# Altium footprint library ST封装.PcbLib: 1336 footprints (part 71 of 109)
Each footprint in its own frame and in the unit in brackets; x right, y up, seen from the top. Pads: shape width x height; smd on the part's side, far side on the other; paste and mask are expansions set on the pad; w line width, h text height; cw(c..) or ccw(c..) is an arc to the next point about the centre after c.
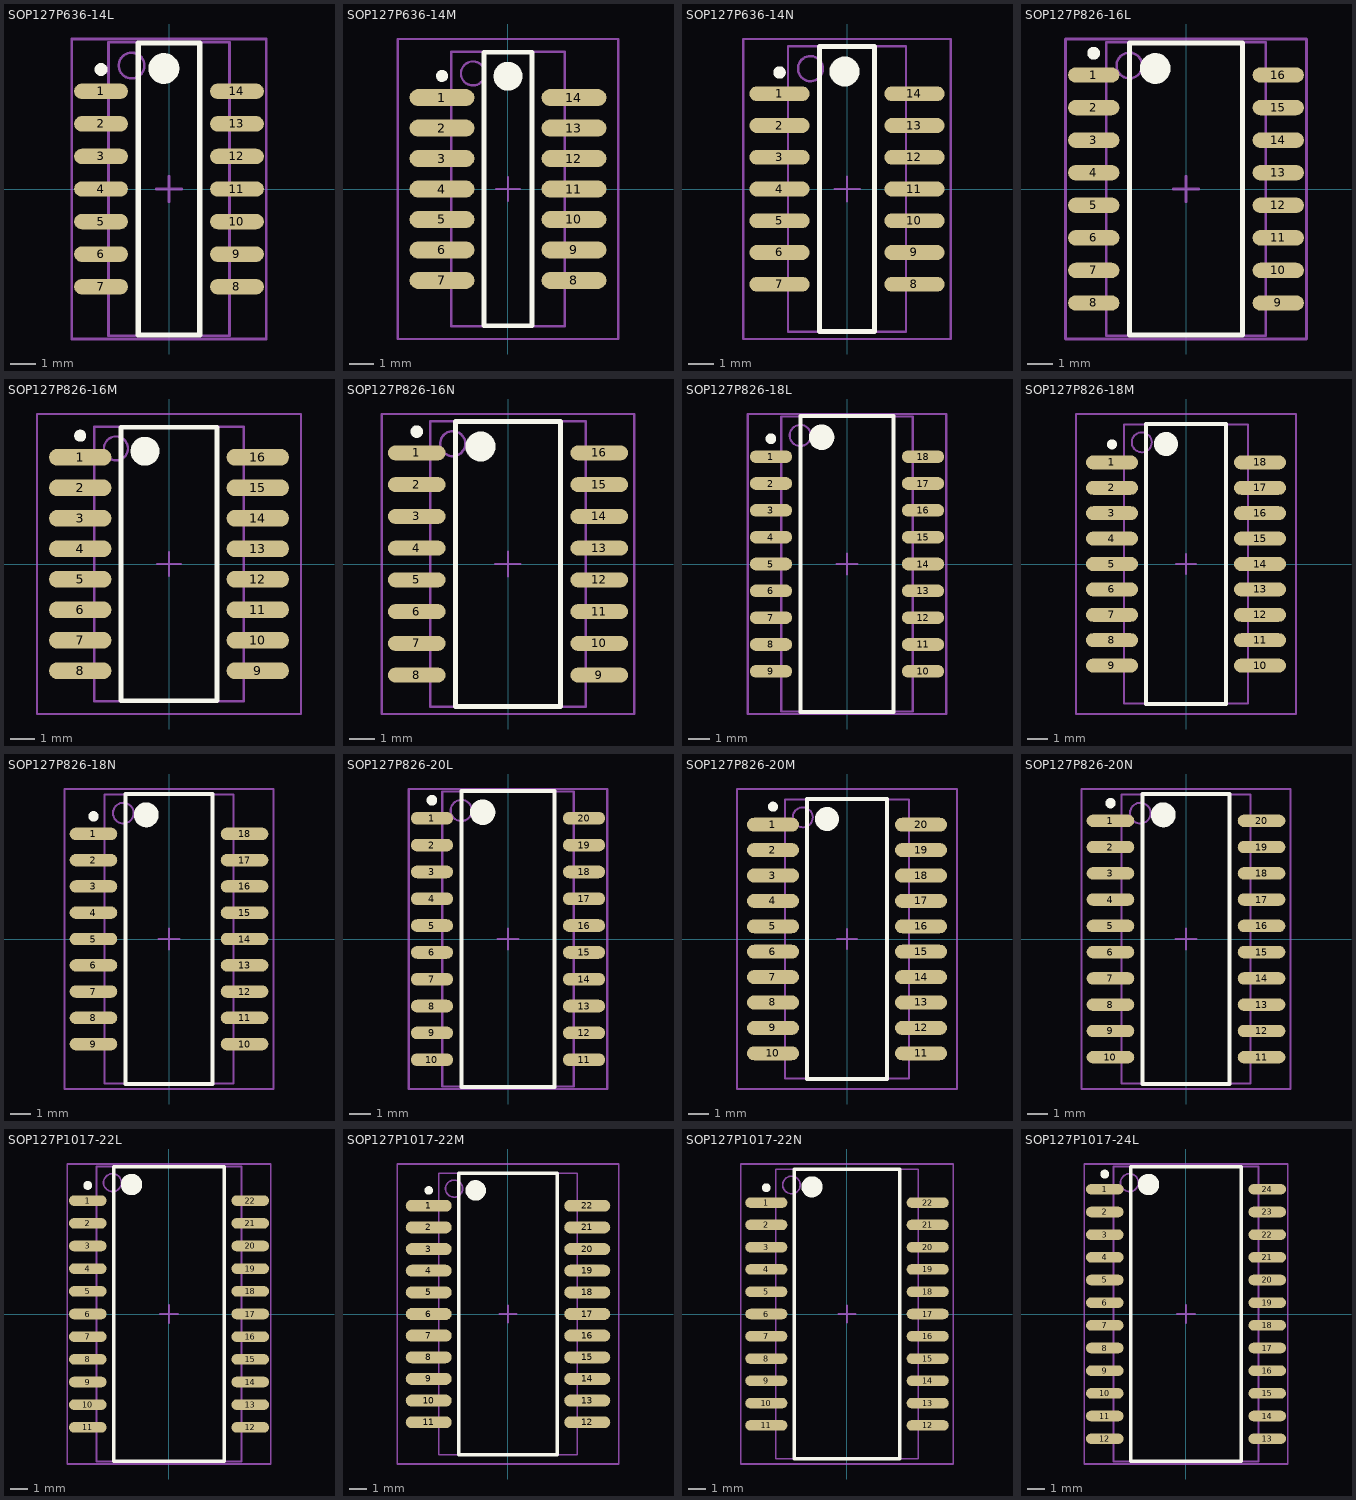
[diagram p70: the footprints below, top view; thin cyan lines are the x and y axes]

## SOP127P636-14L [mm] "SOP, 14-Leads, Body 11x4.7mm, Pitch 1.27mm, IPC High Density"
height 1.5
pads (14):
  oval 2.1x0.6 smd: 1(-2.65,3.81) 2(-2.65,2.54) 3(-2.65,1.27) 4(-2.65,0) 5(-2.65,-1.27) 6(-2.65,-2.54) 7(-2.65,-3.81) 8(2.65,-3.81) 9(2.65,-2.54) 10(2.65,-1.27) 11(2.65,0) 12(2.65,1.27) 13(2.65,2.54) 14(2.65,3.81)
Top Overlay:
  circle w0.6: c-0.2,4.7 r0.3
  circle w0.25: c-2.65,4.66 r0.125
  lines w0.2: -1.2,-5.7 1.2,-5.7 1.2,5.7 -1.2,5.7 -1.2,-5.7
Mechanical 13:
  circle w0.1: c-1.46,4.815 r0.5
  lines w0.1: -2.36,-5.715 2.36,-5.715 2.36,5.715 -2.36,5.715 -2.36,-5.715
Mechanical 15:
  lines w0.1: -0.5,0 0.5,0 ; 0,-0.5 0,0.5 ; -3.8,-5.85 3.8,-5.85 3.8,5.85 -3.8,5.85 -3.8,-5.85
3D body: height 1.5, standoff 0, extent -2.36,-5.715 2.36,5.715

## SOP127P636-14M [mm] "SOP, 14-Leads, Body 11x4.7mm, Pitch 1.27mm, IPC Low Density"
height 1.5
pads (14):
  oval 2.7x0.7 smd: 1(-2.75,3.81) 2(-2.75,2.54) 3(-2.75,1.27) 4(-2.75,0) 5(-2.75,-1.27) 6(-2.75,-2.54) 7(-2.75,-3.81) 8(2.75,-3.81) 9(2.75,-2.54) 10(2.75,-1.27) 11(2.75,0) 12(2.75,1.27) 13(2.75,2.54) 14(2.75,3.81)
Top Overlay:
  circle w0.6: c0,4.7 r0.3
  circle w0.25: c-2.75,4.71 r0.125
  lines w0.2: -1,-5.7 1,-5.7 1,5.7 -1,5.7 -1,-5.7
Mechanical 13:
  circle w0.1: c-1.46,4.815 r0.5
  lines w0.1: -2.36,-5.715 2.36,-5.715 2.36,5.715 -2.36,5.715 -2.36,-5.715
Mechanical 15:
  lines w0.1: -0.5,0 0.5,0 ; 0,-0.5 0,0.5 ; -4.6,-6.25 4.6,-6.25 4.6,6.25 -4.6,6.25 -4.6,-6.25
3D body: height 1.5, standoff 0, extent -2.36,-5.715 2.36,5.715

## SOP127P636-14N [mm] "SOP, 14-Leads, Body 11x4.7mm, Pitch 1.27mm, IPC Medium Density"
height 1.5
pads (14):
  oval 2.4x0.6 smd: 1(-2.7,3.81) 2(-2.7,2.54) 3(-2.7,1.27) 4(-2.7,0) 5(-2.7,-1.27) 6(-2.7,-2.54) 7(-2.7,-3.81) 8(2.7,-3.81) 9(2.7,-2.54) 10(2.7,-1.27) 11(2.7,0) 12(2.7,1.27) 13(2.7,2.54) 14(2.7,3.81)
Top Overlay:
  circle w0.6: c-0.1,4.7 r0.3
  circle w0.25: c-2.7,4.66 r0.125
  lines w0.2: -1.1,-5.7 1.1,-5.7 1.1,5.7 -1.1,5.7 -1.1,-5.7
Mechanical 13:
  circle w0.1: c-1.46,4.815 r0.5
  lines w0.1: -2.36,-5.715 2.36,-5.715 2.36,5.715 -2.36,5.715 -2.36,-5.715
Mechanical 15:
  lines w0.1: -0.5,0 0.5,0 ; 0,-0.5 0,0.5 ; -4.15,-6 4.15,-6 4.15,6 -4.15,6 -4.15,-6
3D body: height 1.5, standoff 0, extent -2.36,-5.715 2.36,5.715

## SOP127P826-16L [mm] "SOP, 16-Leads, Body 11x6.2mm, Pitch 1.27mm, IPC High Density"
height 2
pads (16):
  oval 2x0.6 smd: 1(-3.6,4.445) 2(-3.6,3.175) 3(-3.6,1.905) 4(-3.6,0.635) 5(-3.6,-0.635) 6(-3.6,-1.905) 7(-3.6,-3.175) 8(-3.6,-4.445) 9(3.6,-4.445) 10(3.6,-3.175) 11(3.6,-1.905) 12(3.6,-0.635) 13(3.6,0.635) 14(3.6,1.905) 15(3.6,3.175) 16(3.6,4.445)
Top Overlay:
  circle w0.25: c-3.6,5.295 r0.125
  circle w0.6: c-1.2,4.7 r0.3
  lines w0.2: -2.2,-5.7 -2.2,5.7 2.2,5.7 2.2,-5.7 -2.2,-5.7
Mechanical 13:
  circle w0.1: c-2.21,4.815 r0.5
  lines w0.1: -3.11,-5.715 -3.11,5.715 3.11,5.715 3.11,-5.715 -3.11,-5.715
Mechanical 15:
  lines w0.1: -0.5,0 0.5,0 ; 0,-0.5 0,0.5 ; -4.7,-5.85 -4.7,5.85 4.7,5.85 4.7,-5.85 -4.7,-5.85
3D body: height 2, standoff 0, extent -3.11,-5.715 3.11,5.715

## SOP127P826-16M [mm] "SOP, 16-Leads, Body 11x6.2mm, Pitch 1.27mm, IPC Low Density"
height 2
pads (16):
  oval 2.6x0.7 smd: 1(-3.7,4.445) 2(-3.7,3.175) 3(-3.7,1.905) 4(-3.7,0.635) 5(-3.7,-0.635) 6(-3.7,-1.905) 7(-3.7,-3.175) 8(-3.7,-4.445) 9(3.7,-4.445) 10(3.7,-3.175) 11(3.7,-1.905) 12(3.7,-0.635) 13(3.7,0.635) 14(3.7,1.905) 15(3.7,3.175) 16(3.7,4.445)
Top Overlay:
  circle w0.25: c-3.7,5.345 r0.125
  circle w0.6: c-1,4.7 r0.3
  lines w0.2: -2,-5.7 -2,5.7 2,5.7 2,-5.7 -2,-5.7
Mechanical 13:
  circle w0.1: c-2.21,4.815 r0.5
  lines w0.1: -3.11,-5.715 -3.11,5.715 3.11,5.715 3.11,-5.715 -3.11,-5.715
Mechanical 15:
  lines w0.1: -0.5,0 0.5,0 ; 0,-0.5 0,0.5 ; -5.5,-6.25 -5.5,6.25 5.5,6.25 5.5,-6.25 -5.5,-6.25
3D body: height 2, standoff 0, extent -3.11,-5.715 3.11,5.715

## SOP127P826-16N [mm] "SOP, 16-Leads, Body 11x6.2mm, Pitch 1.27mm, IPC Medium Density"
height 2
pads (16):
  oval 2.3x0.6 smd: 1(-3.65,4.445) 2(-3.65,3.175) 3(-3.65,1.905) 4(-3.65,0.635) 5(-3.65,-0.635) 6(-3.65,-1.905) 7(-3.65,-3.175) 8(-3.65,-4.445) 9(3.65,-4.445) 10(3.65,-3.175) 11(3.65,-1.905) 12(3.65,-0.635) 13(3.65,0.635) 14(3.65,1.905) 15(3.65,3.175) 16(3.65,4.445)
Top Overlay:
  circle w0.25: c-3.65,5.295 r0.125
  circle w0.6: c-1.1,4.7 r0.3
  lines w0.2: -2.1,-5.7 -2.1,5.7 2.1,5.7 2.1,-5.7 -2.1,-5.7
Mechanical 13:
  circle w0.1: c-2.21,4.815 r0.5
  lines w0.1: -3.11,-5.715 -3.11,5.715 3.11,5.715 3.11,-5.715 -3.11,-5.715
Mechanical 15:
  lines w0.1: -0.5,0 0.5,0 ; 0,-0.5 0,0.5 ; -5.05,-6 -5.05,6 5.05,6 5.05,-6 -5.05,-6
3D body: height 2, standoff 0, extent -3.11,-5.715 3.11,5.715

## SOP127P826-18L [mm] "SOP, 18-Leads, Body 13.4x6.2mm, Pitch 1.27mm, IPC High Density"
height 2
pads (18):
  oval 2x0.6 smd: 1(-3.6,5.08) 2(-3.6,3.81) 3(-3.6,2.54) 4(-3.6,1.27) 5(-3.6,0) 6(-3.6,-1.27) 7(-3.6,-2.54) 8(-3.6,-3.81) 9(-3.6,-5.08) 10(3.6,-5.08) 11(3.6,-3.81) 12(3.6,-2.54) 13(3.6,-1.27) 14(3.6,0) 15(3.6,1.27) 16(3.6,2.54) 17(3.6,3.81) 18(3.6,5.08)
Top Overlay:
  circle w0.25: c-3.6,5.93 r0.125
  circle w0.6: c-1.2,6 r0.3
  lines w0.2: -2.2,-7 -2.2,7 2.2,7 2.2,-7 -2.2,-7
Mechanical 13:
  circle w0.1: c-2.21,6.085 r0.5
  lines w0.1: -3.11,-6.985 -3.11,6.985 3.11,6.985 3.11,-6.985 -3.11,-6.985
Mechanical 15:
  lines w0.1: -0.5,0 0.5,0 ; 0,-0.5 0,0.5 ; -4.7,-7.1 -4.7,7.1 4.7,7.1 4.7,-7.1 -4.7,-7.1
3D body: height 2, standoff 0, extent -3.11,-6.985 3.11,6.985

## SOP127P826-18M [mm] "SOP, 18-Leads, Body 13.4x6.2mm, Pitch 1.27mm, IPC Low Density"
height 2
pads (18):
  oval 2.6x0.7 smd: 1(-3.7,5.08) 2(-3.7,3.81) 3(-3.7,2.54) 4(-3.7,1.27) 5(-3.7,0) 6(-3.7,-1.27) 7(-3.7,-2.54) 8(-3.7,-3.81) 9(-3.7,-5.08) 10(3.7,-5.08) 11(3.7,-3.81) 12(3.7,-2.54) 13(3.7,-1.27) 14(3.7,0) 15(3.7,1.27) 16(3.7,2.54) 17(3.7,3.81) 18(3.7,5.08)
Top Overlay:
  circle w0.25: c-3.7,5.98 r0.125
  circle w0.6: c-1,6 r0.3
  lines w0.2: -2,-7 -2,7 2,7 2,-7 -2,-7
Mechanical 13:
  circle w0.1: c-2.21,6.085 r0.5
  lines w0.1: -3.11,-6.985 -3.11,6.985 3.11,6.985 3.11,-6.985 -3.11,-6.985
Mechanical 15:
  lines w0.1: -0.5,0 0.5,0 ; 0,-0.5 0,0.5 ; -5.5,-7.5 -5.5,7.5 5.5,7.5 5.5,-7.5 -5.5,-7.5
3D body: height 2, standoff 0, extent -3.11,-6.985 3.11,6.985

## SOP127P826-18N [mm] "SOP, 18-Leads, Body 13.4x6.2mm, Pitch 1.27mm, IPC Medium Density"
height 2
pads (18):
  oval 2.3x0.6 smd: 1(-3.65,5.08) 2(-3.65,3.81) 3(-3.65,2.54) 4(-3.65,1.27) 5(-3.65,0) 6(-3.65,-1.27) 7(-3.65,-2.54) 8(-3.65,-3.81) 9(-3.65,-5.08) 10(3.65,-5.08) 11(3.65,-3.81) 12(3.65,-2.54) 13(3.65,-1.27) 14(3.65,0) 15(3.65,1.27) 16(3.65,2.54) 17(3.65,3.81) 18(3.65,5.08)
Top Overlay:
  circle w0.6: c-1.1,6 r0.3
  circle w0.25: c-3.65,5.93 r0.125
  lines w0.2: -2.1,-7 2.1,-7 2.1,7 -2.1,7 -2.1,-7
Mechanical 13:
  circle w0.1: c-2.21,6.085 r0.5
  lines w0.1: -3.11,-6.985 3.11,-6.985 3.11,6.985 -3.11,6.985 -3.11,-6.985
Mechanical 15:
  lines w0.1: -0.5,0 0.5,0 ; 0,-0.5 0,0.5 ; -5.05,-7.25 5.05,-7.25 5.05,7.25 -5.05,7.25 -5.05,-7.25
3D body: height 2, standoff 0, extent -3.11,-6.985 3.11,6.985

## SOP127P826-20L [mm] "SOP, 20-Leads, Body 13.4x6.2mm, Pitch 1.27mm, IPC High Density"
height 2
pads (20):
  oval 2x0.6 smd: 1(-3.6,5.715) 2(-3.6,4.445) 3(-3.6,3.175) 4(-3.6,1.905) 5(-3.6,0.635) 6(-3.6,-0.635) 7(-3.6,-1.905) 8(-3.6,-3.175) 9(-3.6,-4.445) 10(-3.6,-5.715) 11(3.6,-5.715) 12(3.6,-4.445) 13(3.6,-3.175) 14(3.6,-1.905) 15(3.6,-0.635) 16(3.6,0.635) 17(3.6,1.905) 18(3.6,3.175) 19(3.6,4.445) 20(3.6,5.715)
Top Overlay:
  circle w0.6: c-1.2,6 r0.3
  circle w0.25: c-3.6,6.565 r0.125
  lines w0.2: -2.2,-7 2.2,-7 2.2,7 -2.2,7 -2.2,-7
Mechanical 13:
  circle w0.1: c-2.21,6.085 r0.5
  lines w0.1: -3.11,-6.985 3.11,-6.985 3.11,6.985 -3.11,6.985 -3.11,-6.985
Mechanical 15:
  lines w0.1: -0.5,0 0.5,0 ; 0,-0.5 0,0.5 ; -4.7,-7.1 4.7,-7.1 4.7,7.1 -4.7,7.1 -4.7,-7.1
3D body: height 2, standoff 0, extent -3.11,-6.985 3.11,6.985

## SOP127P826-20M [mm] "SOP, 20-Leads, Body 13.4x6.2mm, Pitch 1.27mm, IPC Low Density"
height 2
pads (20):
  oval 2.6x0.7 smd: 1(-3.7,5.715) 2(-3.7,4.445) 3(-3.7,3.175) 4(-3.7,1.905) 5(-3.7,0.635) 6(-3.7,-0.635) 7(-3.7,-1.905) 8(-3.7,-3.175) 9(-3.7,-4.445) 10(-3.7,-5.715) 11(3.7,-5.715) 12(3.7,-4.445) 13(3.7,-3.175) 14(3.7,-1.905) 15(3.7,-0.635) 16(3.7,0.635) 17(3.7,1.905) 18(3.7,3.175) 19(3.7,4.445) 20(3.7,5.715)
Top Overlay:
  circle w0.6: c-1,6 r0.3
  circle w0.25: c-3.7,6.615 r0.125
  lines w0.2: -2,-7 2,-7 2,7 -2,7 -2,-7
Mechanical 13:
  circle w0.1: c-2.21,6.085 r0.5
  lines w0.1: -3.11,-6.985 3.11,-6.985 3.11,6.985 -3.11,6.985 -3.11,-6.985
Mechanical 15:
  lines w0.1: -0.5,0 0.5,0 ; 0,-0.5 0,0.5 ; -5.5,-7.5 5.5,-7.5 5.5,7.5 -5.5,7.5 -5.5,-7.5
3D body: height 2, standoff 0, extent -3.11,-6.985 3.11,6.985

## SOP127P826-20N [mm] "SOP, 20-Leads, Body 13.4x6.2mm, Pitch 1.27mm, IPC Medium Density"
height 2
pads (20):
  oval 2.3x0.6 smd: 1(-3.65,5.715) 2(-3.65,4.445) 3(-3.65,3.175) 4(-3.65,1.905) 5(-3.65,0.635) 6(-3.65,-0.635) 7(-3.65,-1.905) 8(-3.65,-3.175) 9(-3.65,-4.445) 10(-3.65,-5.715) 11(3.65,-5.715) 12(3.65,-4.445) 13(3.65,-3.175) 14(3.65,-1.905) 15(3.65,-0.635) 16(3.65,0.635) 17(3.65,1.905) 18(3.65,3.175) 19(3.65,4.445) 20(3.65,5.715)
Top Overlay:
  circle w0.25: c-3.65,6.565 r0.125
  circle w0.6: c-1.1,6 r0.3
  lines w0.2: -2.1,-7 -2.1,7 2.1,7 2.1,-7 -2.1,-7
Mechanical 13:
  circle w0.1: c-2.21,6.085 r0.5
  lines w0.1: -3.11,-6.985 -3.11,6.985 3.11,6.985 3.11,-6.985 -3.11,-6.985
Mechanical 15:
  lines w0.1: -0.5,0 0.5,0 ; 0,-0.5 0,0.5 ; -5.05,-7.25 -5.05,7.25 5.05,7.25 5.05,-7.25 -5.05,-7.25
3D body: height 2, standoff 0, extent -3.11,-6.985 3.11,6.985

## SOP127P1017-22L [mm] "SOP, 22-Leads, Body 15.6x8.1mm, Pitch 1.27mm, IPC High Density"
height 2.5
pads (22):
  oval 2.1x0.6 smd: 1(-4.55,6.35) 2(-4.55,5.08) 3(-4.55,3.81) 4(-4.55,2.54) 5(-4.55,1.27) 6(-4.55,0) 7(-4.55,-1.27) 8(-4.55,-2.54) 9(-4.55,-3.81) 10(-4.55,-5.08) 11(-4.55,-6.35) 12(4.55,-6.35) 13(4.55,-5.08) 14(4.55,-3.81) 15(4.55,-2.54) 16(4.55,-1.27) 17(4.55,0) 18(4.55,1.27) 19(4.55,2.54) 20(4.55,3.81) 21(4.55,5.08) 22(4.55,6.35)
Top Overlay:
  circle w0.6: c-2.1,7.25 r0.3
  circle w0.25: c-4.55,7.2 r0.125
  lines w0.2: -3.1,-8.25 3.1,-8.25 3.1,8.25 -3.1,8.25 -3.1,-8.25
Mechanical 13:
  circle w0.1: c-3.165,7.355 r0.5
  lines w0.1: -4.065,-8.255 4.065,-8.255 4.065,8.255 -4.065,8.255 -4.065,-8.255
Mechanical 15:
  lines w0.1: -0.5,0 0.5,0 ; 0,-0.5 0,0.5 ; -5.7,-8.4 5.7,-8.4 5.7,8.4 -5.7,8.4 -5.7,-8.4
3D body: height 2.5, standoff 0, extent -4.065,-8.255 4.065,8.255

## SOP127P1017-22M [mm] "SOP, 22-Leads, Body 15.6x8.1mm, Pitch 1.27mm, IPC Low Density"
height 2.5
pads (22):
  oval 2.7x0.7 smd: 1(-4.65,6.35) 2(-4.65,5.08) 3(-4.65,3.81) 4(-4.65,2.54) 5(-4.65,1.27) 6(-4.65,0) 7(-4.65,-1.27) 8(-4.65,-2.54) 9(-4.65,-3.81) 10(-4.65,-5.08) 11(-4.65,-6.35) 12(4.65,-6.35) 13(4.65,-5.08) 14(4.65,-3.81) 15(4.65,-2.54) 16(4.65,-1.27) 17(4.65,0) 18(4.65,1.27) 19(4.65,2.54) 20(4.65,3.81) 21(4.65,5.08) 22(4.65,6.35)
Top Overlay:
  circle w0.6: c-1.9,7.25 r0.3
  circle w0.25: c-4.65,7.25 r0.125
  lines w0.2: -2.9,-8.25 2.9,-8.25 2.9,8.25 -2.9,8.25 -2.9,-8.25
Mechanical 13:
  circle w0.1: c-3.165,7.355 r0.5
  lines w0.1: -4.065,-8.255 4.065,-8.255 4.065,8.255 -4.065,8.255 -4.065,-8.255
Mechanical 15:
  lines w0.1: -0.5,0 0.5,0 ; 0,-0.5 0,0.5 ; -6.5,-8.8 6.5,-8.8 6.5,8.8 -6.5,8.8 -6.5,-8.8
3D body: height 2.5, standoff 0, extent -4.065,-8.255 4.065,8.255

## SOP127P1017-22N [mm] "SOP, 22-Leads, Body 15.6x8.1mm, Pitch 1.27mm, IPC Medium Density"
height 2.5
pads (22):
  oval 2.4x0.6 smd: 1(-4.6,6.35) 2(-4.6,5.08) 3(-4.6,3.81) 4(-4.6,2.54) 5(-4.6,1.27) 6(-4.6,0) 7(-4.6,-1.27) 8(-4.6,-2.54) 9(-4.6,-3.81) 10(-4.6,-5.08) 11(-4.6,-6.35) 12(4.6,-6.35) 13(4.6,-5.08) 14(4.6,-3.81) 15(4.6,-2.54) 16(4.6,-1.27) 17(4.6,0) 18(4.6,1.27) 19(4.6,2.54) 20(4.6,3.81) 21(4.6,5.08) 22(4.6,6.35)
Top Overlay:
  circle w0.25: c-4.6,7.2 r0.125
  circle w0.6: c-2,7.25 r0.3
  lines w0.2: -3,-8.25 -3,8.25 3,8.25 3,-8.25 -3,-8.25
Mechanical 13:
  circle w0.1: c-3.165,7.355 r0.5
  lines w0.1: -4.065,-8.255 -4.065,8.255 4.065,8.255 4.065,-8.255 -4.065,-8.255
Mechanical 15:
  lines w0.1: -0.5,0 0.5,0 ; 0,-0.5 0,0.5 ; -6.05,-8.55 -6.05,8.55 6.05,8.55 6.05,-8.55 -6.05,-8.55
3D body: height 2.5, standoff 0, extent -4.065,-8.255 4.065,8.255

## SOP127P1017-24L [mm] "SOP, 24-Leads, Body 15.6x8.1mm, Pitch 1.27mm, IPC High Density"
height 2.5
pads (24):
  oval 2.1x0.6 smd: 1(-4.55,6.985) 2(-4.55,5.715) 3(-4.55,4.445) 4(-4.55,3.175) 5(-4.55,1.905) 6(-4.55,0.635) 7(-4.55,-0.635) 8(-4.55,-1.905) 9(-4.55,-3.175) 10(-4.55,-4.445) 11(-4.55,-5.715) 12(-4.55,-6.985) 13(4.55,-6.985) 14(4.55,-5.715) 15(4.55,-4.445) 16(4.55,-3.175) 17(4.55,-1.905) 18(4.55,-0.635) 19(4.55,0.635) 20(4.55,1.905) 21(4.55,3.175) 22(4.55,4.445) 23(4.55,5.715) 24(4.55,6.985)
Top Overlay:
  circle w0.6: c-2.1,7.25 r0.3
  circle w0.25: c-4.55,7.835 r0.125
  lines w0.2: -3.1,-8.25 3.1,-8.25 3.1,8.25 -3.1,8.25 -3.1,-8.25
Mechanical 13:
  circle w0.1: c-3.165,7.355 r0.5
  lines w0.1: -4.065,-8.255 4.065,-8.255 4.065,8.255 -4.065,8.255 -4.065,-8.255
Mechanical 15:
  lines w0.1: -0.5,0 0.5,0 ; 0,-0.5 0,0.5 ; -5.7,-8.4 5.7,-8.4 5.7,8.4 -5.7,8.4 -5.7,-8.4
3D body: height 2.5, standoff 0, extent -4.065,-8.255 4.065,8.255